# Altium footprint library AltiumDesignerLibraries.PcbLib: 313 footprints (part 12 of 20)
Each footprint in its own frame and in the unit in brackets; x right, y up, seen from the top. Pads: shape width x height; smd on the part's side, far side on the other; paste and mask are expansions set on the pad; w line width, h text height; cw(c..) or ccw(c..) is an arc to the next point about the centre after c.
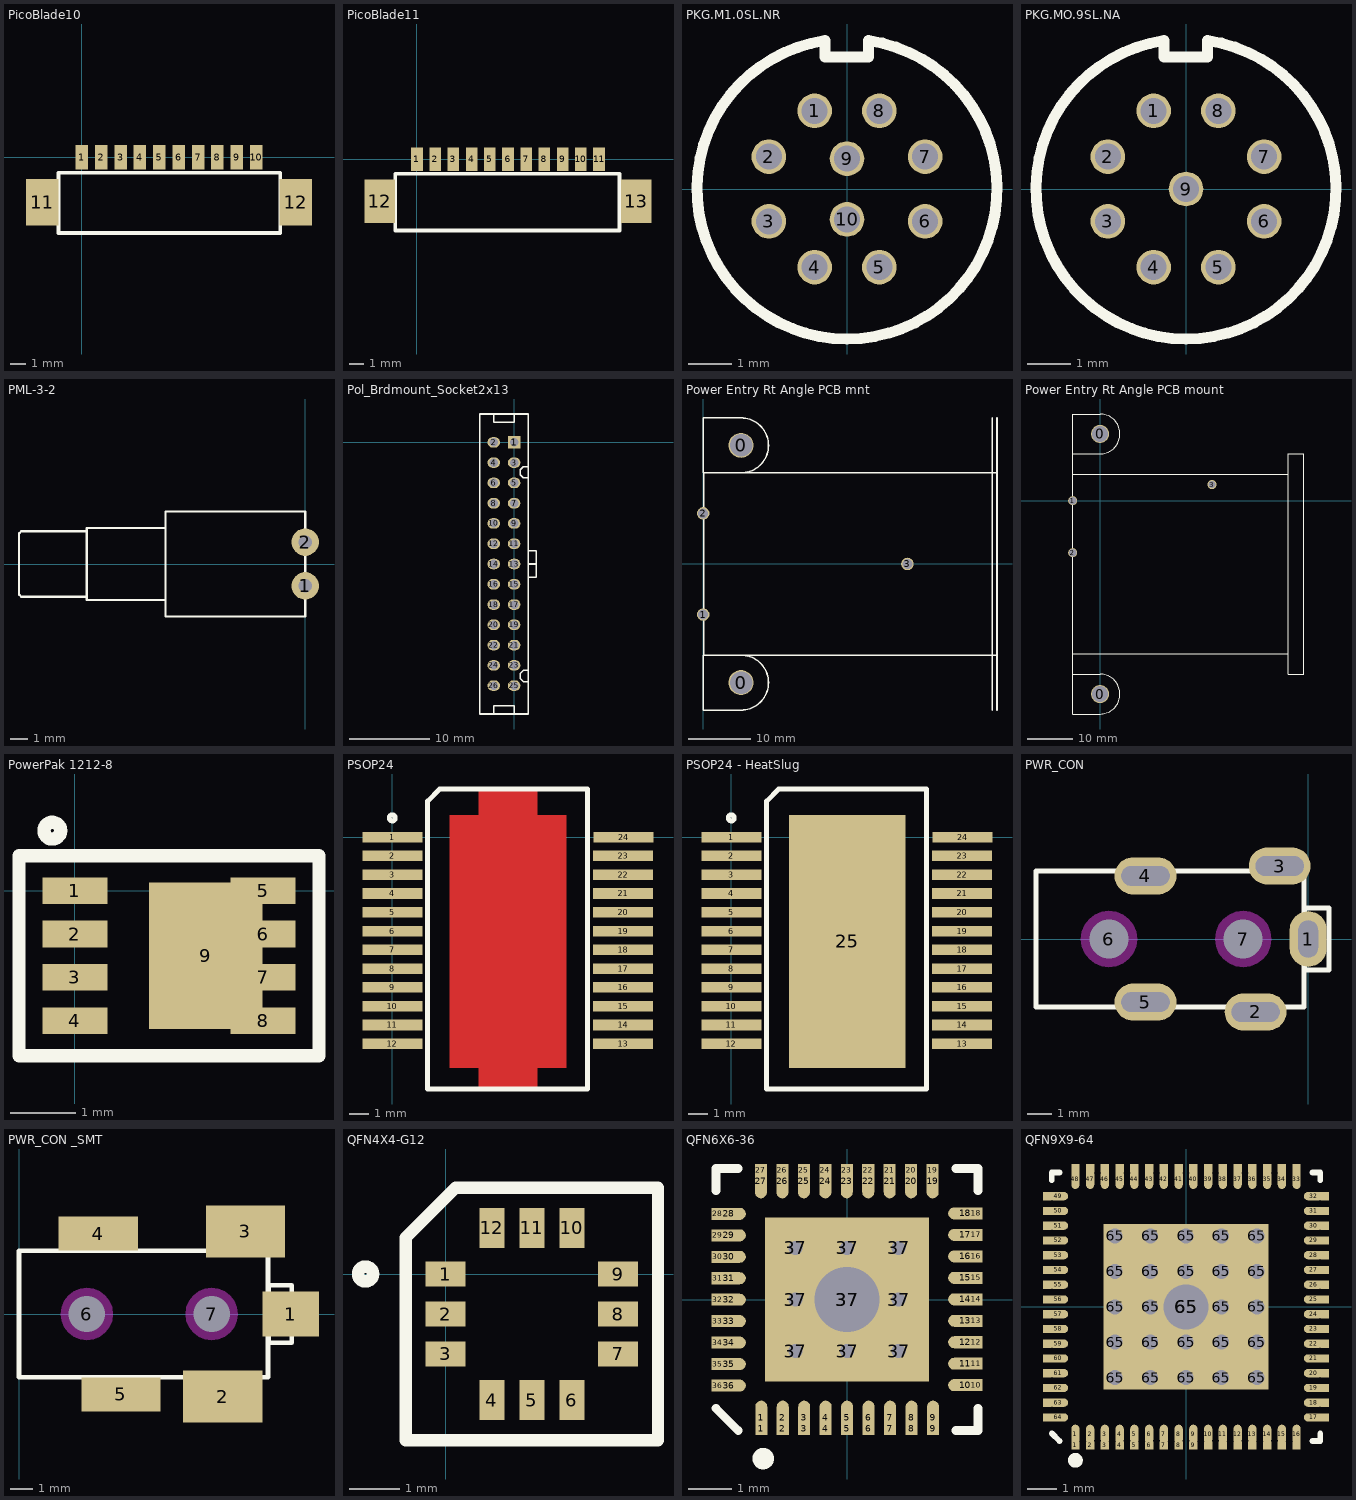
[diagram p11: the footprints below, top view; thin cyan lines are the x and y axes]

## PicoBlade10 [mm] "Surfact Mount Right Angle"
height 3.404
pads (12):
  rect 0.8x1.6 smd: 1(0,0) 2(1.25,0) 3(2.5,0) 4(3.75,0) 5(5,0) 6(6.25,0) 7(7.5,0) 8(8.75,0) 9(10,0) 10(11.25,0)
  rect 2.1x3 smd: 11(-2.55,-2.9) 12(13.8,-2.9)
Top Overlay:
  lines w0.254: -1.5,-4.9 -1.5,-1 12.8,-1 12.8,-4.9 -1.5,-4.9
3D body: height 3.4, standoff 0, extent -3.225,-4.9 14.425,0.3

## PicoBlade11 [mm] "Surfact Mount Right Angle"
height 3.404
pads (13):
  rect 0.8x1.6 smd: 1(0,0) 2(1.25,0) 3(2.5,0) 4(3.75,0) 5(5,0) 6(6.25,0) 7(7.5,0) 8(8.75,0) 9(10,0) 10(11.25,0) 11(12.5,0)
  rect 2.1x3 smd: 12(-2.55,-2.9) 13(15.05,-2.9)
Top Overlay:
  lines w0.254: -1.5,-4.9 13.9,-4.9 13.9,-1 -1.5,-1 -1.5,-4.9
3D body: height 3.4, standoff 0, extent -3.2,-5 15.7,0.2

## PKG.M1.0SL.NR [mm]
pads (10):
  round 0.8 hole 0.6: 1(-0.746,1.805) 2(-1.805,0.746) 3(-1.805,-0.746) 4(-0.746,-1.805) 5(0.746,-1.805) 6(1.805,-0.746) 7(1.805,0.746) 8(0.746,1.805) 9(0,0.7) 10(0,-0.7)
Top Overlay:
  lines w0.254: -0.508,3.048 -0.508,3.429 ccw(c0,0) 0.5,3.43 ; -0.5,3.048 0.5,3.048 0.5,3.429
3D body: height 20.52, standoff -3.98, extent -9.691,-9.206 9.691,9.206

## PKG.MO.9SL.NA [mm]
pads (9):
  round 0.8 hole 0.6: 1(-0.746,1.805) 2(-1.805,0.746) 3(-1.805,-0.746) 4(-0.746,-1.805) 5(0.746,-1.805) 6(1.805,-0.746) 7(1.805,0.746) 8(0.746,1.805) 9(0,0)
Top Overlay:
  lines w0.254: -0.508,3.048 -0.508,3.429 ccw(c0,0) 0.5,3.43 ; -0.5,3.048 0.5,3.048 0.5,3.429
3D body: height 20.52, standoff -3.98, extent -9.691,-9.206 9.691,9.206

## PML-3-2 [mm] "Flexible Light Pipe Adapter"
height 12.6
pads (2):
  round 1.6 hole 0.8: 1(0,-1.27) 2(0,1.27)
Top Overlay:
  lines w0.127: -12.7,-1.905 -16.51,-1.905 -16.637,-1.778 -16.637,1.778 -16.51,1.905 -12.7,1.905 ; -8.2,-2.1 -12.7,-2.1 -12.7,2.1 -8.2,2.1 ; -8.128,-3.05 -8.128,3.05 ; -8.1,-3.046 0,-3.046 ; -8.1,3.05 0,3.05 0,-3.05

## Pol_Brdmount_Socket2x13 [mil] "Polarized Boardmount socket 26pin"
pads (26):
  rect 62x62 hole 42 unplated: 1(0,0)
  oval 62x52 hole 42 unplated: 2(-100,0) 3(0,-100) 4(-100,-100) 5(0,-200) 6(-100,-200) 7(0,-300) 8(-100,-300) 9(0,-400) 10(-100,-400) 11(0,-500) 12(-100,-500) 13(0,-600) 14(-100,-600) 15(0,-700) 16(-100,-700) 17(0,-800) 18(-100,-800) 19(0,-900) 20(-100,-900) 21(0,-1000) 22(-100,-1000) 23(0,-1100) 24(-100,-1100) 25(0,-1200) 26(-100,-1200)
Top Overlay:
  lines w7.87: -100,-1340 -100,-1300 0,-1300 0,-1340 ; -100,140 -100,100 0,100 0,140 ; 70,-1180 45,-1180 30,-1165 30,-1140 45,-1125 70,-1125 ; 70,-665 110,-665 110,-600 ; 70,-600 110,-600 ; 70,-535 110,-535 110,-600 ; 70,-175 45,-175 30,-160 30,-135 45,-120 70,-120 ; -170,-1340 -170,140 70,140 70,-1340 -170,-1340

## Power Entry Rt Angle PCB mnt [mm] "Fuse tray no switch"
pads (5):
  round 4 hole 3.6: 0(6.05,-19) 0(6.05,19)
  round 2 hole 1.6: 1(0,-8.1) 2(0,8.1) 3(32.7,0)
Top Overlay:
  lines w0.254: 0,14.593 0,23.393 6.05,23.393 cw(c6.05,18.993) 6.05,14.593 ; 0.063,-14.539 0.063,14.593 6.05,14.593 ; 46.304,-23.393 46.304,23.386 ; 47.05,-23.402 47.05,23.377 ; 47.05,-14.602 6.05,-14.602 ; 47.05,14.58 47.037,14.593 6.05,14.593 ; 6.05,-14.602 cw(c6.05,-19.002) 6.05,-23.402 0,-23.402 0,-14.602 6.05,-14.602
3D body: height 37.6, standoff -4.55, extent -6.43,-23.451 51.65,23.349

## Power Entry Rt Angle PCB mount [mm]
pads (5):
  round 4 hole 3.6: 0(0,-42.75) 0(0,14.75)
  round 2 hole 1.6: 1(-6.05,0) 2(-6.05,-11.5) 3(24.75,3.55)
Top Overlay:
  lines w0.254: -5.987,10.35 0,10.35 ccw(c0,14.75) 0,19.15 -6.05,19.15 -6.05,10.35 -6.05,5.85 ; 41.491,-33.85 -6.05,-33.85 ; 41.542,5.85 -6.05,5.85 ; -6.05,-38.35 -6.05,-47.15 0,-47.15 ccw(c0,-42.75) 0,-38.35 -6.05,-38.35 ; -6.05,-38.35 -6.05,-33.85 ; -6.05,-33.85 -6.05,0 -6.05,5.85 ; 41.55,-38.35 41.55,10.35 45.05,10.35 45.05,-38.35 41.55,-38.35
3D body: height 32.5, standoff -5.02, extent -16.408,-47.072 44.892,19.228

## PowerPak 1212-8 [mil]
height 43.31
pads (9):
  rect 39x16 smd mask+3: 1(0,0) 2(0,-26) 3(0,-52) 4(0,-78) 5(113,0) 6(113,-26) 7(113,-52) 8(113,-78)
  rect 68x88 smd mask+3: 9(78.5,-39)
Top Overlay:
  circle w8: c-13.5,36 r5
  lines w8: -33.5,-99 146.5,-99 146.5,21 -33.5,21 -33.5,-99

## PSOP24 [mil] "PA241 High Voltage opamp footprint"
pads (24):
  rect 125x22 smd: 1(0,0) 2(0,-39) 3(0,-78) 4(0,-117) 5(0,-156) 6(0,-195) 7(0,-234) 8(0,-273) 9(0,-312) 10(0,-351) 11(0,-390) 12(0,-429) 13(479,-429) 14(479,-390) 15(479,-351) 16(479,-312) 17(479,-273) 18(479,-234) 19(479,-195) 20(479,-156) 21(479,-117) 22(479,-78) 23(479,-39) 24(480,0)
Top Layer:
  rectangle: 179,-523 301,100
  rectangle: 119,-479 361,46
Top Overlay:
  circle w10: c-0.4,40 r6.4
  lines w10: 103,100 405,100 405,-523 73,-523 73,75 98,100 122,100

## PSOP24 - HeatSlug [mil] "PA241 High Voltage opamp footprint"
height 3937.01
pads (25):
  rect 125x22 smd: 1(0,0) 2(0,-39) 3(0,-78) 4(0,-117) 5(0,-156) 6(0,-195) 7(0,-234) 8(0,-273) 9(0,-312) 10(0,-351) 11(0,-390) 12(0,-429) 13(479,-429) 14(479,-390) 15(479,-351) 16(479,-312) 17(479,-273) 18(479,-234) 19(479,-195) 20(479,-156) 21(479,-117) 22(479,-78) 23(479,-39) 24(480,0)
  rect 241.97x525 smd: 25(240.16,-216.54)
Top Overlay:
  circle w10: c-0.4,40 r6.4
  lines w10: 103,100 405,100 405,-523 73,-523 73,75 98,100 122,100

## PWR_CON [mil] "0.65mm CON045"
pads (7):
  oval 60x90 hole 32 slot 60 at 90 deg mask+3: 1(0,0)
  oval 100x60 hole 32 slot 78 at 0 deg mask+3: 2(-85,-118) 3(-46,118) 4(-263,102) 5(-263,-102)
  round 50 hole 63 unplated mask+9.5: 6(-322,0) 7(-105,0)
Top Overlay:
  lines w8: -440,-110 -7,-110 -7,110 -440,110 -440,-110 ; -6,-50 34,-50 34,50 -6,50 -6,-50
Keep-Out Layer:
  pour cut-out: -276.61,0 -278.16,11.75 -282.69,22.69 -289.91,32.09 -299.31,39.31 -310.25,43.84 -322,45.39 -333.75,43.84 -344.69,39.31 -354.09,32.09 -361.31,22.69 -365.84,11.75 -367.39,0 -365.84,-11.75 -361.31,-22.69 -354.09,-32.09 -344.69,-39.31 -333.75,-43.84 -322,-45.39 -310.25,-43.84 -299.31,-39.31 -289.91,-32.09 -282.69,-22.69 -278.16,-11.75
  pour cut-out: -59.61,0 -61.16,11.75 -65.69,22.69 -72.91,32.09 -82.31,39.31 -93.25,43.84 -105,45.39 -116.75,43.84 -127.69,39.31 -137.09,32.09 -144.31,22.69 -148.84,11.75 -150.39,0 -148.84,-11.75 -144.31,-22.69 -137.09,-32.09 -127.69,-39.31 -116.75,-43.84 -105,-45.39 -93.25,-43.84 -82.31,-39.31 -72.91,-32.09 -65.69,-22.69 -61.16,-11.75

## PWR_CON _SMT [mm] "0.65mm CON045"
pads (7):
  rect 2.5x2 smd mask+0.076: 1(12,0)
  rect 3.5x2.3 smd mask+0.076: 2(9,-3.65) 3(10,3.65)
  rect 3.5x1.5 smd mask+0.076: 4(3.5,3.55) 5(4.5,-3.55)
  round 1.27 hole 1.6 unplated mask+0.241: 6(2.997,0) 7(8.509,0)
Top Overlay:
  lines w0.203: 0,-2.794 0,2.794 10.998,2.794 10.998,-2.794 0,-2.794 ; 11.024,-1.27 11.024,1.27 12.04,1.27 12.04,-1.27 11.024,-1.27
Keep-Out Layer:
  pour cut-out: 9.662,0 9.623,0.298 9.507,0.576 9.324,0.815 9.085,0.998 8.807,1.114 8.509,1.153 8.211,1.114 7.933,0.998 7.694,0.815 7.511,0.576 7.395,0.298 7.356,0 7.395,-0.298 7.511,-0.576 7.694,-0.815 7.933,-0.998 8.211,-1.114 8.509,-1.153 8.807,-1.114 9.085,-0.998 9.324,-0.815 9.507,-0.576 9.623,-0.298
  pour cut-out: 4.15,0 4.111,0.298 3.996,0.576 3.812,0.815 3.574,0.998 3.296,1.114 2.997,1.153 2.699,1.114 2.421,0.998 2.182,0.815 1.999,0.576 1.884,0.298 1.844,0 1.884,-0.298 1.999,-0.576 2.182,-0.815 2.421,-0.998 2.699,-1.114 2.997,-1.153 3.296,-1.114 3.574,-0.998 3.812,-0.815 3.996,-0.576 4.111,-0.298

## QFN4X4-G12 [mm] "QFN 12 pin MAX1932 footprint"
pads (12):
  rect 0.8x0.5 smd: 1(0,0) 2(0,-0.8) 3(0,-1.6) 7(3.45,-1.6) 8(3.45,-0.8) 9(3.45,0)
  rect 0.5x0.8 smd: 4(0.925,-2.525) 5(1.725,-2.525) 6(2.525,-2.525) 10(2.525,0.925) 11(1.725,0.925) 12(0.925,0.925)
Top Overlay:
  circle w0.25: c-1.6,0 r0.15
  lines w0.25: -0.8,-3.325 4.25,-3.325 4.25,1.725 0.2,1.725 -0.8,0.725 -0.8,-3.325

## QFN6X6-36 [mm]
pads (82):
  rect 0.28x0.28 smd: 1(-1.996,-3.015) 2(-1.496,-3.015) 3(-0.996,-3.015) 4(-0.496,-3.015) 5(0.004,-3.015) 6(0.504,-3.015) 7(1.004,-3.015) 8(1.504,-3.015) 9(2.004,-3.015) 10(3.015,-1.995) 11(3.015,-1.495) 12(3.015,-0.995) 13(3.015,-0.495) 14(3.015,0.005) 15(3.015,0.505) 16(3.015,1.005) 17(3.015,1.505) 18(3.015,2.005) 19(1.995,3.015) 20(1.495,3.015) 21(0.995,3.015) 22(0.495,3.015) 23(-0.005,3.015) 24(-0.505,3.015) 25(-1.005,3.015) 26(-1.505,3.015) 27(-2.005,3.015) 28(-3.015,1.995) 29(-3.015,1.495) 30(-3.015,0.995) 31(-3.015,0.495) 32(-3.015,-0.005) 33(-3.015,-0.505) 34(-3.015,-1.005) 35(-3.015,-1.505) 36(-3.015,-2.005)
  oval 0.28x0.8 smd: 1(-1.996,-2.755) 2(-1.496,-2.755) 3(-0.996,-2.755) 4(-0.496,-2.755) 5(0.004,-2.755) 6(0.504,-2.755) 7(1.004,-2.755) 8(1.504,-2.755) 9(2.004,-2.755) 19(1.995,2.755) 20(1.495,2.755) 21(0.995,2.755) 22(0.495,2.755) 23(-0.005,2.755) 24(-0.505,2.755) 25(-1.005,2.755) 26(-1.505,2.755) 27(-2.005,2.755)
  oval 0.8x0.28 smd: 10(2.755,-1.995) 11(2.755,-1.495) 12(2.755,-0.995) 13(2.755,-0.495) 14(2.755,0.005) 15(2.755,0.505) 16(2.755,1.005) 17(2.755,1.505) 18(2.755,2.005) 28(-2.755,1.995) 29(-2.755,1.495) 30(-2.755,0.995) 31(-2.755,0.495) 32(-2.755,-0.005) 33(-2.755,-0.505) 34(-2.755,-1.005) 35(-2.755,-1.505) 36(-2.755,-2.005)
  round 0.66 hole 0.33: 37(-1.2,-1.2) 37(-1.2,0) 37(-1.2,1.2) 37(0,-1.2) 37(0,1.2) 37(1.2,-1.2) 37(1.2,0) 37(1.2,1.2)
  rect 3.82x3.82 smd: 37(0,0)
  round 1.778 hole 1.524: 37(0,0)
Top Overlay:
  circle w0.25: c-1.95,-3.705 r0.125
  lines w0.2: -3.05,-2.535 -2.535,-3.05 ; -3.05,2.535 -3.05,3.05 -2.535,3.05 ; 2.535,-3.05 3.05,-3.05 3.05,-2.535 ; 2.535,3.05 3.05,3.05 3.05,2.535

## QFN9X9-64 [mm]
pads (154):
  rect 0.28x0.28 smd: 1(-3.75,-4.7) 2(-3.25,-4.7) 3(-2.75,-4.7) 4(-2.25,-4.7) 5(-1.75,-4.7) 6(-1.25,-4.7) 7(-0.75,-4.7) 8(-0.25,-4.7) 9(0.25,-4.7) 10(0.75,-4.7) 11(1.25,-4.7) 12(1.75,-4.7) 13(2.25,-4.7) 14(2.75,-4.7) 15(3.25,-4.7) 16(3.75,-4.7) 17(4.7,-3.75) 18(4.7,-3.25) 19(4.7,-2.75) 20(4.7,-2.25) 21(4.7,-1.75) 22(4.7,-1.25) 23(4.7,-0.75) 24(4.7,-0.25) 25(4.7,0.25) 26(4.7,0.75) 27(4.7,1.25) 28(4.7,1.75) 29(4.7,2.25) 30(4.7,2.75) 31(4.7,3.25) 32(4.7,3.75) 33(3.75,4.7) 34(3.25,4.7) 35(2.75,4.7) 36(2.25,4.7) 37(1.75,4.7) 38(1.25,4.7) 39(0.75,4.7) 40(0.25,4.7) 41(-0.25,4.7) 42(-0.75,4.7) 43(-1.25,4.7) 44(-1.75,4.7) 45(-2.25,4.7) 46(-2.75,4.7) 47(-3.25,4.7) 48(-3.75,4.7) 49(-4.7,3.75) 50(-4.7,3.25) 51(-4.7,2.75) 52(-4.7,2.25) 53(-4.7,1.75) 54(-4.7,1.25) 55(-4.7,0.75) 56(-4.7,0.25) 57(-4.7,-0.25) 58(-4.7,-0.75) 59(-4.7,-1.25) 60(-4.7,-1.75) 61(-4.7,-2.25) 62(-4.7,-2.75) 63(-4.7,-3.25) 64(-4.7,-3.75)
  oval 0.28x0.66 smd: 1(-3.75,-4.325) 2(-3.25,-4.325) 3(-2.75,-4.325) 4(-2.25,-4.325) 5(-1.75,-4.325) 6(-1.25,-4.325) 7(-0.75,-4.325) 8(-0.25,-4.325) 9(0.25,-4.325) 10(0.75,-4.325) 11(1.25,-4.325) 12(1.75,-4.325) 13(2.25,-4.325) 14(2.75,-4.325) 15(3.25,-4.325) 16(3.75,-4.325) 33(3.75,4.325) 34(3.25,4.325) 35(2.75,4.325) 36(2.25,4.325) 37(1.75,4.325) 38(1.25,4.325) 39(0.75,4.325) 40(0.25,4.325) 41(-0.25,4.325) 42(-0.75,4.325) 43(-1.25,4.325) 44(-1.75,4.325) 45(-2.25,4.325) 46(-2.75,4.325) 47(-3.25,4.325) 48(-3.75,4.325)
  oval 0.66x0.28 smd: 17(4.325,-3.75) 18(4.325,-3.25) 19(4.325,-2.75) 20(4.325,-2.25) 21(4.325,-1.75) 22(4.325,-1.25) 23(4.325,-0.75) 24(4.325,-0.25) 25(4.325,0.25) 26(4.325,0.75) 27(4.325,1.25) 28(4.325,1.75) 29(4.325,2.25) 30(4.325,2.75) 31(4.325,3.25) 32(4.325,3.75) 49(-4.325,3.75) 50(-4.325,3.25) 51(-4.325,2.75) 52(-4.325,2.25) 53(-4.325,1.75) 54(-4.325,1.25) 55(-4.325,0.75) 56(-4.325,0.25) 57(-4.325,-0.25) 58(-4.325,-0.75) 59(-4.325,-1.25) 60(-4.325,-1.75) 61(-4.325,-2.25) 62(-4.325,-2.75) 63(-4.325,-3.25) 64(-4.325,-3.75)
  round 0.762 hole 0.508: 65(-2.4,-2.4) 65(-2.4,-1.2) 65(-2.4,0) 65(-2.4,1.2) 65(-2.4,2.4) 65(-1.2,-2.4) 65(-1.2,-1.2) 65(-1.2,0) 65(-1.2,1.2) 65(-1.2,2.4) 65(0,-2.4) 65(0,-1.2) 65(0,1.2) 65(0,2.4) 65(1.2,-2.4) 65(1.2,-1.2) 65(1.2,0) 65(1.2,1.2) 65(1.2,2.4) 65(2.4,-2.4) 65(2.4,-1.2) 65(2.4,0) 65(2.4,1.2) 65(2.4,2.4)
  rect 5.601x5.601 on Top hole 1.524: 65(0,0)
  round 2.21 hole 1.524: 65(0,0)
Top Overlay:
  circle w0.25: c-3.75,-5.205 r0.125
  lines w0.2: -4.55,-4.29 -4.29,-4.55 ; -4.55,4.29 -4.55,4.55 -4.29,4.55 ; 4.29,-4.55 4.55,-4.55 4.55,-4.29 ; 4.29,4.55 4.55,4.55 4.55,4.29